# Altium footprint library connectors_terminal.PcbLib: 42 footprints (part 2 of 3)
Each footprint in its own frame and in the unit in brackets; x right, y up, seen from the top. Pads: shape width x height; smd on the part's side, far side on the other; paste and mask are expansions set on the pad; w line width, h text height; cw(c..) or ccw(c..) is an arc to the next point about the centre after c.
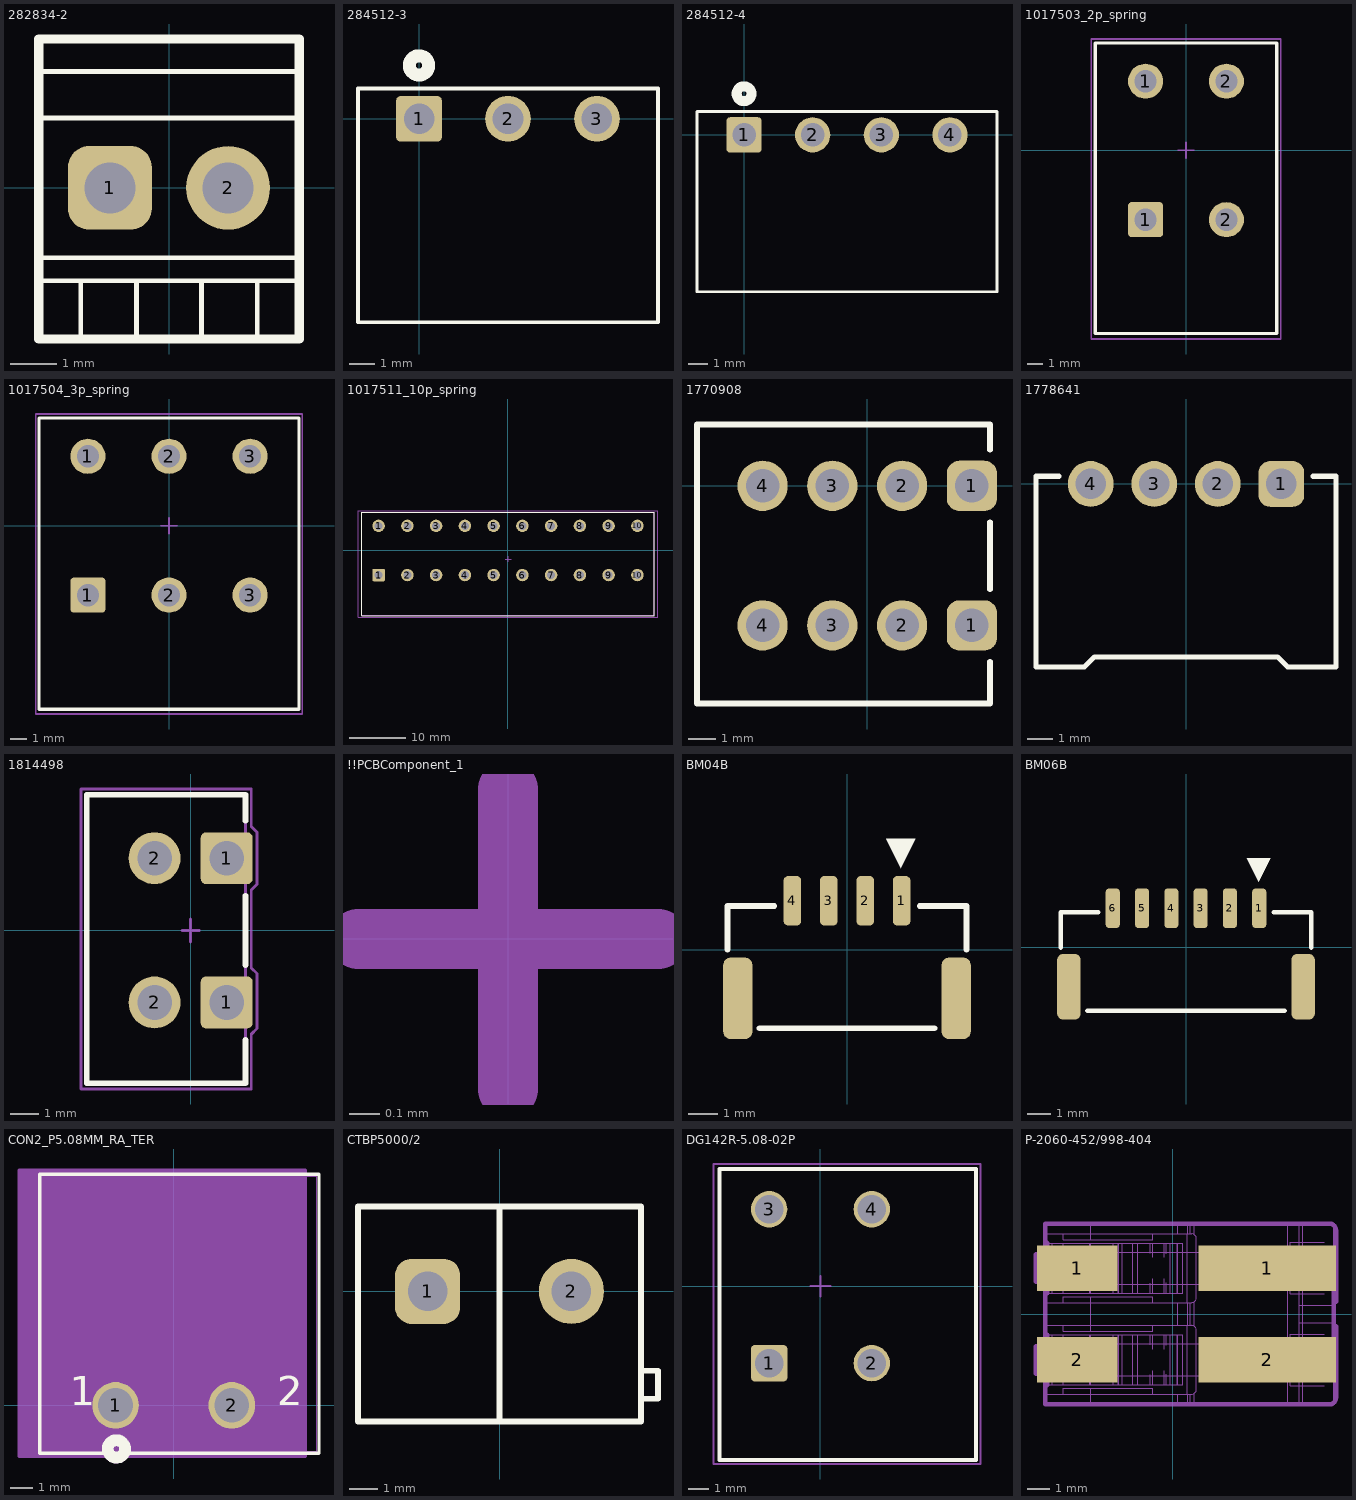
[diagram p1: the footprints below, top view; thin cyan lines are the x and y axes]

## 282834-2 [mm] "te"
height 0.025
pads (2):
  rrect50% 1.8x1.8 hole 1.1 mask+0.127: 1(-1.27,0)
  round 1.8 hole 1.1 mask+0.127: 2(1.27,0)
Top Overlay:
  lines w0.1: -2.8,-2 2.8,-2 ; -2.8,-1.5 2.8,-1.5 ; -2.8,1.5 2.8,1.5 ; -2.8,2.5 2.8,2.5 ; -1.9,-3.25 -1.9,-2 ; -0.7,-3.25 -0.7,-2 ; 0.7,-3.25 0.7,-2 ; 1.9,-3.25 1.9,-2
  lines w0.2: -2.8,-3.25 2.8,-3.25 2.8,3.2 -2.8,3.2 -2.8,-3.25
3D body "282834-2-3d.stp": height 10.1, standoff -3.3, extent -2.77,-3.25 2.77,3.25

## 284512-3 [mm] "1844223 Phoenix Contact"
pads (3):
  rrect20% 1.8x1.8 hole 1.2 paste+0 mask+0: 1(0,0)
  round 1.8 hole 1.2 paste+0 mask+0: 2(3.5,0) 3(7,0)
Top Overlay:
  circle w0.508: c0,2.1 r0.381
  lines w0.152: -2.4,-8 -2.4,1.2 9.4,1.2 9.4,-8 -2.4,-8
Bottom Overlay:
  circle w0.508: c0,2.1 r0.381
3D body "pxc_1844223_05_MC-1-5-3-G-3-5_3D.stp": height 7.3, standoff -3.35, extent -2.45,-8 9.45,1.2

## 284512-4 [mm] "1844236  Phoenix Contact"
pads (4):
  rrect20% 1.8x1.8 hole 1.2 paste+0 mask+0: 1(0,0)
  round 1.8 hole 1.2 paste+0 mask+0: 2(3.5,0) 3(7,0) 4(10.5,0)
Top Overlay:
  circle w0.508: c0,2.1 r0.381
  lines w0.152: -2.4,-8 -2.4,1.2 12.9,1.2 12.9,-8 -2.4,-8
Bottom Overlay:
  circle w0.508: c0,2.1 r0.381
3D body "pxc_1844236_05_MC-1-5-4-G-3-5_3D.stp": height 7.3, standoff -3.35, extent -2.45,-8 12.95,1.2

## 1017503_2p_spring [mm] "TDPT 2,5/ 3-SP-5,08, TERM BLK 3P SIDE ENT 5.08MM PCB"
height 0.025
pads (4):
  rrect20% 2.2x2.2 hole 1.4 mask+0.127: 1(-2.54,-4.35)
  round 2.2 hole 1.4 mask+0.127: 1(-2.54,4.35) 2(2.54,-4.35) 2(2.54,4.35)
Top Overlay:
  lines w0.2: -5.7,-11.5 5.7,-11.5 5.7,6.75 -5.7,6.75 -5.7,-11.5
M3_comm_top:
  text ".comment" at 0,0 h1
M5_asm_top:
  lines w0.1: -5.7,-11.5 5.7,-11.5 5.7,6.75 -5.7,6.75 -5.7,-11.5
  text ".Designator" at -1.425,7.025 h1
M7_courtyard_top:
  lines w0.1: -0.5,0 0.5,0 ; 0,-0.5 0,0.5 ; -5.95,-11.85 5.95,-11.85 5.95,7 -5.95,7 -5.95,-11.85
3D body "1017503.stp": height 19, standoff -3.5, extent -5.475,-11.4 5.485,6.6

## 1017504_3p_spring [mm] "TDPT 2,5/ 3-SP-5,08, TERM BLK 3P SIDE ENT 5.08MM PCB"
height 0.025
pads (6):
  rrect20% 2.2x2.2 hole 1.4 mask+0.127: 1(-5.08,-4.35)
  round 2.2 hole 1.4 mask+0.127: 1(-5.08,4.35) 2(0,-4.35) 2(0,4.35) 3(5.08,-4.35) 3(5.08,4.35)
Top Overlay:
  lines w0.2: -8.15,-11.5 8.15,-11.5 8.15,6.75 -8.15,6.75 -8.15,-11.5
M3_comm_top:
  text ".comment" at 0,0 h1
M5_asm_top:
  lines w0.1: -8.15,-11.5 8.15,-11.5 8.15,6.75 -8.15,6.75 -8.15,-11.5
  text ".Designator" at -2.125,7.05 h1
M7_courtyard_top:
  lines w0.1: -0.5,0 0.5,0 ; 0,-0.5 0,0.5 ; -8.35,-11.8 8.35,-11.8 8.35,7 -8.35,7 -8.35,-11.8
3D body "1017504.stp": height 19, standoff -3.5, extent -8.015,-11.4 8.025,6.6

## 1017511_10p_spring [mm] "TERM BLK 10P SIDE ENT 5.08MM PCB"
height 0.025
pads (20):
  rrect20% 2.2x2.2 hole 1.4 mask+0.127: 1(-22.86,-4.35)
  round 2.2 hole 1.4 mask+0.127: 1(-22.86,4.35) 2(-17.78,-4.35) 2(-17.78,4.35) 3(-12.7,-4.35) 3(-12.7,4.35) 4(-7.62,4.35) 4(-7.62,-4.35) 5(-2.54,-4.35) 5(-2.54,4.35) 6(2.54,-4.35) 6(2.54,4.35) 7(7.62,-4.35) 7(7.62,4.35) 8(12.7,-4.35) 8(12.7,4.35) 9(17.78,-4.35) 9(17.78,4.35) 10(22.86,-4.35) 10(22.86,4.35)
Top Overlay:
  lines w0.2: -25.8,-11.5 25.8,-11.5 ; -25.8,-11.475 -25.8,6.75 25.8,6.75 25.8,-11.475
M3_comm_top:
  text ".comment" at 0.05,-1.525 h1
M5_asm_top:
  lines w0.1: -25.8,-11.475 -25.8,6.75 25.8,6.75 25.8,-11.475 -25.8,-11.475
  text ".Designator" at -1.775,6.8 h1
M7_courtyard_top:
  lines w0.1: -0.45,-1.525 0.55,-1.525 ; 0.05,-2.025 0.05,-1.025 ; -26.5,-11.8 26.5,-11.8 26.5,7 -26.5,7 -26.5,-11.8
3D body "1017511.stp": height 19, standoff -3.5, extent -25.8,-11.375 25.8,6.625

## 1770908 [mm]
height 0.025
pads (8):
  rrect50% 1.8x1.8 hole 1.2 mask+0.127: 1(3.75,-5) 1(3.75,0)
  round 1.8 hole 1.2 mask+0.127: 2(1.25,-5) 2(1.25,0) 3(-1.25,-5) 3(-1.25,0) 4(-3.75,-5) 4(-3.75,0)
Top Overlay:
  lines w0.2: 4.4,-6.3 4.4,-7.8 -6.1,-7.8 -6.1,2.2 4.4,2.2 4.4,1.3 ; 4.4,-3.7 4.4,-1.3
3D body "1770908.stp": height 5.05, standoff -2.05, extent -6.1,-7.8 4.4,2.2

## 1778641 [mm]
height 0.025
pads (4):
  rrect50% 1.8x1.8 hole 1.2 mask+0.127: 1(3.75,0)
  round 1.8 hole 1.2 mask+0.127: 2(1.25,0) 3(-1.25,0) 4(-3.75,0)
Top Overlay:
  lines w0.2: -5,0.3 -5.9,0.3 -5.9,-7.2 -4,-7.2 -3.6,-6.8 3.6,-6.8 4,-7.2 5.9,-7.2 5.9,0.3 5,0.3
3D body "1778641.stp": height 5.05, standoff -2.05, extent -5.85,-7.2 5.85,0.6

## 1814498 [mm] "1770885"
height 0.025
pads (4):
  rrect20% 1.8x1.8 hole 1.2 mask+0.127: 1(1.25,-2.5) 1(1.25,2.5)
  round 1.8 hole 1.2 mask+0.127: 2(-1.25,-2.5) 2(-1.25,2.5)
Top Overlay:
  lines w0.2: 1.9,-3.8 1.9,-5.3 -3.6,-5.3 -3.6,4.7 1.9,4.7 1.9,3.8 ; 1.9,-1.2 1.9,1.2
M3_comm_top:
  text ".comment" at -1.4,-0.3 h1
M5_asm_top:
  lines w0.1: -3.6,-5.3 1.9,-5.3 1.9,0.7 1.9,4.7 -3.6,4.7 -3.6,-5.3
  text ".Designator" at -2.5,5.1 h1
M7_courtyard_top:
  lines w0.1: -0.3,0 0.3,0 ; 0,-0.4 0,0.4 ; -3.8,-5.5 -3.8,4.9 2.1,4.9 2.1,3.6 2.3,3.4 2.3,1.6 2.1,1.4 2.1,-1.3 2.3,-1.5 2.3,-3.4 2.1,-3.6 2.1,-5.5 -3.8,-5.5
3D body "1814498.stp": height 5, standoff -2.1, extent -3.6,-5.3 1.9,4.7

## !!PCBComponent_1 [mm]
M3_comm_top:
  text ".comment" at -0.9,-0.3 h1
M5_asm_top:
  text ".Designator" at -1,1.3 h1
M7_courtyard_top:
  lines w0.2: -0.5,0 0.5,0 ; 0,-0.5 0,0.5

## BM04B [mm] "BM04B-GHS-TBT(LF)(SN)(N)"
height 0.025
pads (6):
  rrect50% 0.6x1.7 smd: 1(1.875,1.675) 2(0.625,1.675) 3(-0.625,1.675) 4(-1.875,1.675)
  rrect50% 1x2.8 smd: ""(-3.75,-1.675) ""(3.75,-1.675)
Top Overlay:
  region: 1.35,3.8 2.35,3.8 1.85,2.8
  lines w0.2: -4.1,0 -4.1,1.5 -2.5,1.5 ; -3,-2.7 3,-2.7 ; 2.5,1.5 4.1,1.5 4.1,0
3D body "BM04B-GHS-TBT.STEP": height 4.18, standoff -0.03, extent -4.125,-2.75 4.125,2.2

## BM06B [mm] "BM06B-GHS-TBT(LF)(SN)(N)"
height 0.025
pads (8):
  rrect50% 0.6x1.7 smd: 1(3.125,1.675) 2(1.875,1.675) 3(0.625,1.675) 4(-0.625,1.675) 5(-1.875,1.675) 6(-3.125,1.675)
  rrect50% 1x2.8 smd: ""(-5,-1.675) ""(5,-1.675)
Top Overlay:
  region: 2.6,3.8 3.6,3.8 3.1,2.8
  lines w0.2: -5.35,0 -5.35,1.5 -3.75,1.5 ; -4.2,-2.7 4.2,-2.7 ; 3.75,1.5 5.35,1.5 5.35,0
3D body "BM06B-GHS-TBT.STEP": height 4.18, standoff -0.03, extent -5.375,-2.7 5.375,2.25

## CON2_P5.08MM_RA_TER [mil] "796638-2"
pads (2):
  round 80 hole 60: 1(-100,0) 2(100,0)
Top Overlay:
  lines w6: -230.31,-82.68 -230.31,397.64 250,397.64 250,-82.68 -230.31,-82.68
  lines w20: -99.97,-60.08 ccw(c-98.43,-75) -83.43,-75 ccw(c-98.43,-75) -96.88,-60.08
  text "2" at 178.43,0 h50
  text "2" at 178.43,0 h50
  text "1" at -178.43,0 h50
  text "1" at -178.43,0 h50
Bottom Overlay:
  circle w20: c-98.43,-75 r15
  text "2" at 178.43,0 h50
  text "2" at 178.43,0 h50
  text "1" at -178.43,0 h50
  text "1" at -178.43,0 h50
Mechanical 13:
  circle w20: c-98.43,-75 r15
  lines w1: -226.38,-78.74 -226.38,394 246.06,394 246.06,-78.74 -226.38,-78.74
  text "2" at 178.43,0 h50
  text "2" at 178.43,0 h50
  text "1" at -178.43,0 h50
  text "1" at -178.43,0 h50
Mechanical 15:
  region: 226,404 -266,404 -266,-88 226,-88
  lines w6: -266,-88 226,-88 226,404 -266,404 -266,-88
3D body "c-796638-2-c3-3d.stp": height 330.71, standoff -135.83, extent -225.98,-78.74 245.67,393.7
3D body: height 10, standoff 0, extent 58.43,0 68.43,10

## CTBP5000/2 [mm] "pitch 2.54"
height 0.025
pads (2):
  rrect50% 2.3x2.3 hole 1.4 mask+0.127: 1(-2.54,0)
  round 2.3 hole 1.4 mask+0.127: 2(2.54,0)
Top Overlay:
  lines w0.2: 5,-3.8 5.6,-3.8 5.6,-2.8 5,-2.8
  lines w0.203: 0,-4.6 0,3 ; -5,-4.6 5,-4.6 5,3 -5,3 -5,-4.6
3D body "Terminal-Screw-3A-2way.step": height 10.1, standoff -2.9, extent -5,-4.6 5.6,3

## DG142R-5.08-02P [mm]
height 0.025
pads (4):
  rrect20% 1.8x1.8 hole 1.4 mask+0.127: 1(-2.54,-3.81)
  round 1.8 hole 1.4 mask+0.127: 2(2.54,-3.81) 3(-2.54,3.81) 4(2.54,3.81)
Top Overlay:
  lines w0.2: -5,-8.6 -5,5.8 7.7,5.8 7.7,-8.6 -5,-8.6
M3_comm_top:
  text ".comment" at 0,0 h1
M5_asm_top:
  lines w0.1: -4.997,5.8 -5,5.8 ; -5,5.8 -5,-8.6 7.7,-8.6 7.7,5.8 -5,5.8
  text ".Designator" at -0.1,6 h1
M7_courtyard_top:
  lines w0.1: -0.5,0 0.5,0 ; 0,-0.5 0,0.5 ; -5.3,-8.8 -5.3,6.05 7.925,6.05 7.925,-8.8 -5.3,-8.8
3D body "User Library-KF142R-5_08-MultiConfig.STEP": height 13.4, standoff -3.5, extent -5,-8.45 7.6,5.65

## P-2060-452/998-404 [mm]
pads (4):
  rect 3.5x2 smd: 1(-4.175,2) 2(-4.175,-2)
  rect 6x2 smd: 1(4.125,2) 2(4.125,-2)
M8_courtyard_bot:
  drawing of 192 lines, arcs and shapes, not listed
Mechanical 22:
  lines w0.2: -5.575,-3.95 6.8,-3.95 ; -5.575,3.95 6.8,3.95
3D body "2060-452_998-404.stp": height 5.5, standoff 0, extent -5.975,-3.95 7.125,3.95